# Altium footprint library Cap.PcbLib: 102 footprints (part 3 of 7)
Each footprint in its own frame and in the unit in brackets; x right, y up, seen from the top. Pads: shape width x height; smd on the part's side, far side on the other; paste and mask are expansions set on the pad; w line width, h text height; cw(c..) or ccw(c..) is an arc to the next point about the centre after c.
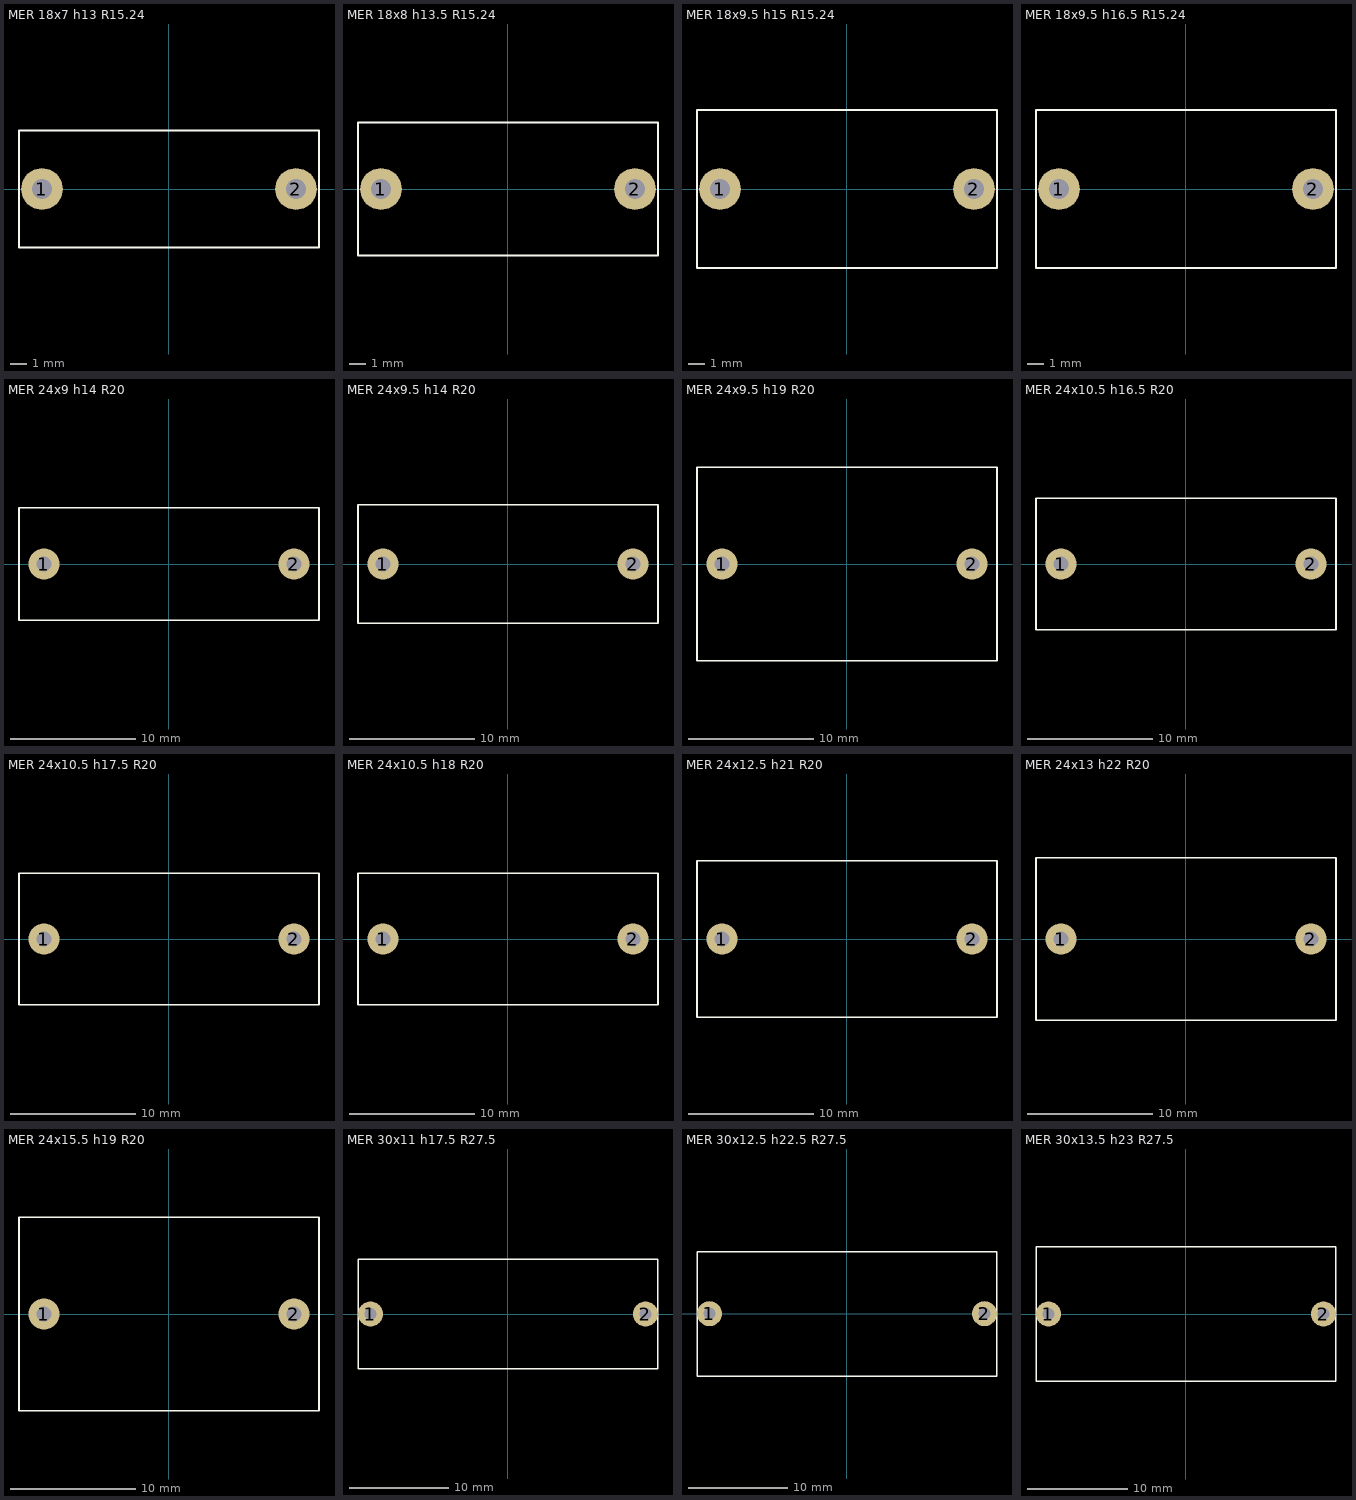
[diagram p2: the footprints below, top view; thin cyan lines are the x and y axes]

## MER 18x7 h13 R15.24 [mm]
pads (2):
  round 2.5 hole 1.2: 1(-7.62,0) 2(7.62,0)
TopOverlay:
  lines w0.127: -9,-3.5 9,-3.5 9,3.5 -9,3.5 -9,-3.5
3D body "MER 18x7 h13 R15.24.STEP": height 14, standoff -2, extent -9,-3.5 9,3.5

## MER 18x8 h13.5 R15.24 [mm]
pads (2):
  round 2.5 hole 1.2: 1(-7.62,0) 2(7.62,0)
TopOverlay:
  lines w0.127: -9,-4 -9,4 9,4 9,-4 -9,-4
3D body "MER 18x8 h13.5 R15.24.STEP": height 14.5, standoff -2, extent -9,-4 9,4

## MER 18x9.5 h15 R15.24 [mm]
pads (2):
  round 2.5 hole 1.2: 1(-7.62,0) 2(7.62,0)
TopOverlay:
  lines w0.127: -9,-4.75 -9,4.75 9,4.75 9,-4.75 -9,-4.75
3D body "MER 18x9.5 h15 R15.24.STEP": height 16, standoff -2, extent -9,-4.75 9,4.75

## MER 18x9.5 h16.5 R15.24 [mm]
pads (2):
  round 2.5 hole 1.2: 1(-7.62,0) 2(7.62,0)
TopOverlay:
  lines w0.127: -9,-4.75 -9,4.75 9,4.75 9,-4.75 -9,-4.75
3D body "MER 18x9.5 h16.5 R15.24.STEP": height 17.5, standoff -2, extent -9,-4.75 9,4.75

## MER 24x9 h14 R20 [mm]
pads (2):
  round 2.5 hole 1.2: 1(-10,0) 2(10,0)
TopOverlay:
  lines w0.127: -12,-4.5 12,-4.5 12,4.5 -12,4.5 -12,-4.5
3D body "MER 24x9 h14 R20.STEP": height 15, standoff -2, extent -12,-4.5 12,4.5

## MER 24x9.5 h14 R20 [mm]
pads (2):
  round 2.5 hole 1.2: 1(-10,0) 2(10,0)
TopOverlay:
  lines w0.127: -12,-4.75 12,-4.75 12,4.75 -12,4.75 -12,-4.75
3D body "MER 24x9.5 h14 R20.STEP": height 15, standoff -2, extent -12,-4.75 12,4.75

## MER 24x9.5 h19 R20 [mm]
pads (2):
  round 2.5 hole 1.2: 1(-10,0) 2(10,0)
TopOverlay:
  lines w0.127: -12,-7.75 -12,7.75 12,7.75 12,-7.75 -12,-7.75
3D body "MER 24x9.5 h19 R20.STEP": height 20, standoff -2, extent -12,-7.75 12,7.75

## MER 24x10.5 h16.5 R20 [mm]
pads (2):
  round 2.5 hole 1.2: 1(-10,0) 2(10,0)
TopOverlay:
  lines w0.127: -12,-5.25 12,-5.25 12,5.25 -12,5.25 -12,-5.25
3D body "MER 24x10.5 h16.5 R20.STEP": height 17.5, standoff -2, extent -12,-5.25 12,5.25

## MER 24x10.5 h17.5 R20 [mm]
pads (2):
  round 2.5 hole 1.2: 1(-10,0) 2(10,0)
TopOverlay:
  lines w0.127: -12,-5.25 -12,5.25 12,5.25 12,-5.25 -12,-5.25
3D body "MER 24x10.5 h17.5 R20.STEP": height 18.5, standoff -2, extent -12,-5.25 12,5.25

## MER 24x10.5 h18 R20 [mm]
pads (2):
  round 2.5 hole 1.2: 1(-10,0) 2(10,0)
TopOverlay:
  lines w0.127: -12,-5.25 12,-5.25 12,5.25 -12,5.25 -12,-5.25
3D body "MER 24x10.5 h18 R20.STEP": height 19, standoff -2, extent -12,-5.25 12,5.25

## MER 24x12.5 h21 R20 [mm]
pads (2):
  round 2.5 hole 1.2: 1(-10,0) 2(10,0)
TopOverlay:
  lines w0.127: -12,-6.25 -12,6.25 12,6.25 12,-6.25 -12,-6.25
3D body "MER 24x12.5 h21 R20.STEP": height 22, standoff -2, extent -12,-6.25 12,6.25

## MER 24x13 h22 R20 [mm]
pads (2):
  round 2.5 hole 1.2: 1(-10,0) 2(10,0)
TopOverlay:
  lines w0.127: -12,-6.5 12,-6.5 12,6.5 -12,6.5 -12,-6.5
3D body "MER 24x13 h22 R20.STEP": height 23, standoff -2, extent -12,-6.5 12,6.5

## MER 24x15.5 h19 R20 [mm]
pads (2):
  round 2.5 hole 1.2: 1(-10,0) 2(10,0)
TopOverlay:
  lines w0.127: -12,-7.75 -12,7.75 12,7.75 12,-7.75 -12,-7.75
3D body "MER 24x15.5 h19 R20.STEP": height 20, standoff -2, extent -12,-7.75 12,7.75

## MER 30x11 h17.5 R27.5 [mm]
pads (2):
  round 2.5 hole 1.2: 1(-13.75,0) 2(13.75,0)
TopOverlay:
  lines w0.127: -15,-5.5 15,-5.5 15,5.5 -15,5.5 -15,-5.5
3D body "MER 30x11 h17.5 R27.5.STEP": height 18.5, standoff -2, extent -15,-5.5 15,5.5

## MER 30x12.5 h22.5 R27.5 [mm]
pads (2):
  round 2.5 hole 1.2: 1(-13.75,0) 2(13.75,0)
TopOverlay:
  lines w0.127: -15,-6.278 15,-6.278 15,6.222 -15,6.222 -15,-6.278
3D body "MER 30x12.5 h22.5 R27.5.STEP": height 23.5, standoff -2, extent -15,-6.25 15,6.25

## MER 30x13.5 h23 R27.5 [mm]
pads (2):
  round 2.5 hole 1.2: 1(-13.75,0) 2(13.75,0)
TopOverlay:
  lines w0.127: -15,-6.75 15,-6.75 15,6.75 -15,6.75 -15,-6.75
3D body "MER 30x13.5 h23 R27.5.STEP": height 24, standoff -2, extent -15,-6.75 15,6.75